# Altium footprint library SparkFun-Connectors.PCBLIB: 409 footprints (part 22 of 26)
Each footprint in its own frame and in the unit in brackets; x right, y up, seen from the top. Pads: shape width x height; smd on the part's side, far side on the other; paste and mask are expansions set on the pad; w line width, h text height; cw(c..) or ccw(c..) is an arc to the next point about the centre after c.
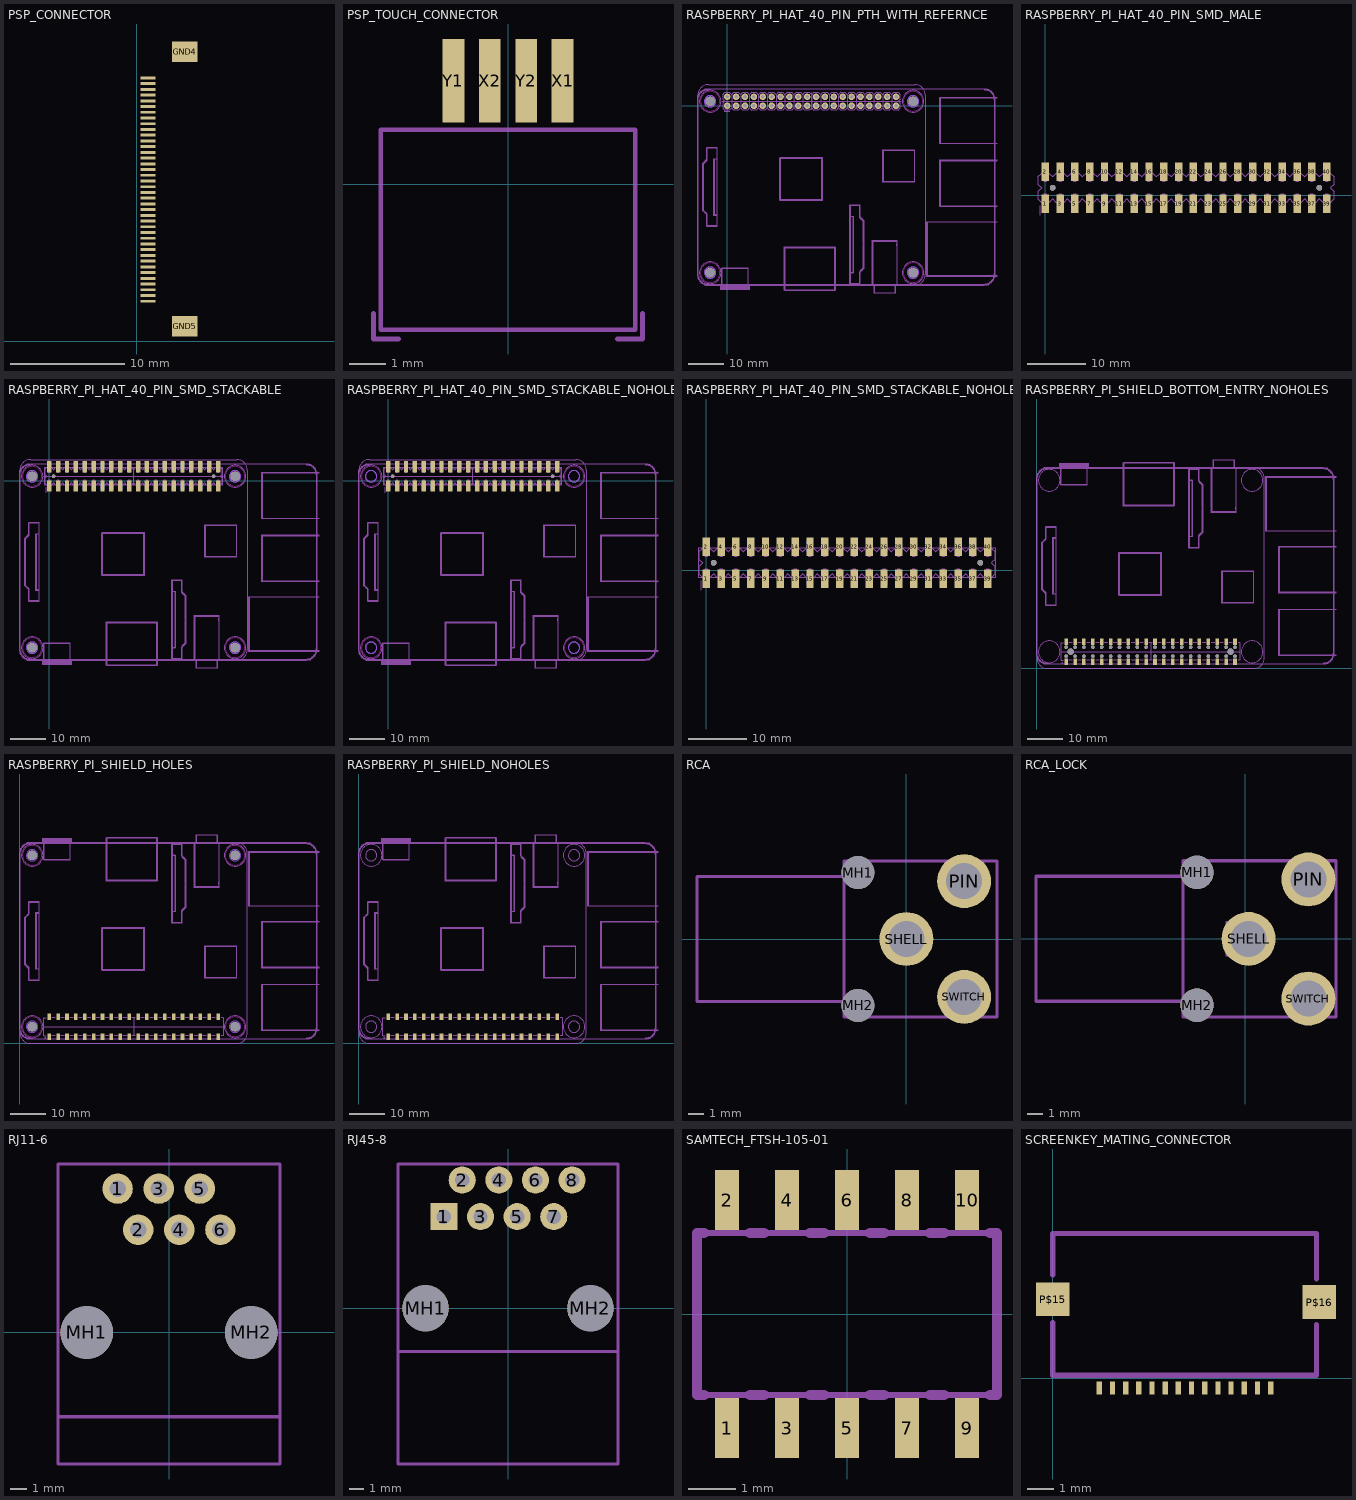
[diagram p21: the footprints below, top view; thin cyan lines are the x and y axes]

## PSP_CONNECTOR [mm]
pads (43):
  rect 0.001x0.001 smd far side: .(4.4,25.3)
  rect 1.27x0.254 smd: AVDD(1,6) AVDD2(1,5.5) B0(1,13) B1(1,12.5) B2(1,12) B3(1,11.5) B4(1,11) B5(1,10.5) B6(1,10) B7(1,9.5) CK(1,8.5) DISP(1,8) G0(1,17) G1(1,16.5) G2(1,16) G3(1,15.5) G4(1,15) G5(1,14.5) G6(1,14) G7(1,13.5) GND(1,23) GND2(1,22.5) GND3(1,9) HSYNC(1,7.5) NC(1,6.5) NC2(1,5) R0(1,21) R1(1,20.5) R2(1,20) R3(1,19.5) R4(1,19) R5(1,18.5) R6(1,18) R7(1,17.5) TEST1(1,4.5) TEST2(1,4) TEST3(1,3.5) VCC(1,22) VCC2(1,21.5) VSYNC(1,7)
  rect 2.2x1.8 smd: GND4(4.2,25.3) GND5(4.2,1.3)

## PSP_TOUCH_CONNECTOR [mil]
pads (4):
  rect 23.62x90.55 smd: X1(59.06,112.2) X2(-19.69,112.2) Y1(-59.06,112.2) Y2(19.69,112.2)
tDocu:
  lines w5: -137.8,-157.48 137.8,-157.48 137.8,59.06 -137.8,59.06 -137.8,-157.48
tPlace:
  lines w5: -145.67,-139.76 -145.67,-167.32 -118.11,-167.32 ; 118.11,-167.32 145.67,-167.32 145.67,-139.76

## RASPBERRY_PI_HAT_40_PIN_PTH_WITH_REFERNCE [mil]
pads (44):
  round 74 hole 40: 1(0,0) 2(0,100) 3(100,0) 4(100,100) 5(200,0) 6(200,100) 7(300,0) 8(300,100) 9(400,0) 10(400,100) 11(500,0) 12(500,100) 13(600,0) 14(600,100) 15(700,0) 16(700,100) 17(800,0) 18(800,100) 19(900,0) 20(900,100) 21(1000,0) 22(1000,100) 23(1100,0) 24(1100,100) 25(1200,0) 26(1200,100) 27(1300,0) 28(1300,100) 29(1400,0) 30(1400,100) 31(1500,0) 32(1500,100) 33(1600,0) 34(1600,100) 35(1700,0) 36(1700,100) 37(1800,0) 38(1800,100) 39(1900,0) 40(1900,100)
  round 108.27 hole 108.27 unplated: MH1(-191.73,-1879) MH2(2091.73,-1879) MH3(2091.73,50.13) MH4(-191.73,50.13)
Top keep-out:
  circle w8: c-191.73,-1879 r63.53
  circle w5: c-191.73,-1879 r110
  circle w5: c2091.73,50.13 r110
  circle w8: c2091.73,50.13 r63.53
  circle w5: c-191.73,50.13 r110
  circle w8: c-191.73,50.13 r63.53
  circle w5: c2091.73,-1879 r110
  circle w8: c2091.73,-1879 r63.53
Bottom keep-out:
  circle w8: c-192.68,-1879 r63.53
  circle w8: c2090.79,50.13 r63.53
  circle w8: c-192.68,50.13 r63.53
  circle w8: c2090.79,-1879 r63.53
tDocu:
  drawing of 40 lines, arcs and shapes, not listed
tPlace:
  lines w8: -35,-65 30,-65 ; 50,-25 25,-50 -25,-50 -50,-25 -50,25 -25,50 -50,75 -50,125 -25,150 25,150 50,125 ; 50,-25 75,-50 125,-50 150,-25 ; 50,-25 50,125 ; 50,125 75,150 125,150 150,125 ; 150,-25 175,-50 225,-50 250,-25 ; 150,-25 150,125 ; 150,125 175,150 225,150 250,125 ; 250,-25 275,-50 325,-50 350,-25 ; 250,-25 250,125 ; 250,125 275,150 325,150 350,125 ; 350,-25 375,-50 425,-50 450,-25 ; 350,-25 350,125 ; 350,125 375,150 425,150 450,125 ; 450,-25 475,-50 525,-50 550,-25 ; 450,-25 450,125 ; 450,125 475,150 525,150 550,125 ; 550,-25 575,-50 625,-50 650,-25 ; 550,-25 550,125 ; 550,125 575,150 625,150 650,125 ; 650,-25 675,-50 725,-50 750,-25 ; 650,-25 650,125 ; 650,125 675,150 725,150 750,125 ; 750,-25 775,-50 825,-50 850,-25 ; 750,-25 750,125 ; 750,125 775,150 825,150 850,125 ; 850,-25 875,-50 925,-50 950,-25 ; 850,-25 850,125 ; 850,125 875,150 925,150 950,125 ; 950,-25 975,-50 1025,-50 1050,-25 ; 950,-25 950,125 ; 950,125 975,150 1025,150 1050,125 ; 1050,-25 1075,-50 1125,-50 1150,-25 ; 1050,-25 1050,125 ; 1050,125 1075,150 1125,150 1150,125 ; 1150,-25 1175,-50 1225,-50 1250,-25 ; 1150,-25 1150,125 ; 1150,125 1175,150 1225,150 1250,125 ; 1250,-25 1250,125 ; 1250,-25 1275,-50 1325,-50 1350,-25 ; 1250,125 1275,150 1325,150 1350,125 ; 1350,-25 1350,125 ; 1350,-25 1375,-50 1425,-50 1450,-25 ; 1350,125 1375,150 1425,150 1450,125 ; 1450,-25 1450,125 ; 1450,-25 1475,-50 1525,-50 1550,-25 ; 1450,125 1475,150 1525,150 1550,125 ; 1550,-25 1550,125 ; 1550,-25 1575,-50 1625,-50 1650,-25 ; 1550,125 1575,150 1625,150 1650,125 ; 1650,-25 1650,125 ; 1650,-25 1675,-50 1725,-50 1750,-25 ; 1650,125 1675,150 1725,150 1750,125 ; 1750,-25 1750,125 ; 1750,-25 1775,-50 1825,-50 1850,-25 ; 1750,125 1775,150 1825,150 1850,125 ; 1850,-25 1850,125 ; 1850,-25 1875,-50 1925,-50 1950,-25 1950,25 1925,50 1950,75 1950,125 1925,150 1875,150 1850,125
bPlace:
  lines w8: -35,-65 30,-65
Reference:
  drawing of 2050 lines, arcs and shapes, not listed
  text "AUDIO" at 1806,-1665 h77.5
  text "HDMI" at 845,-1783 h77.5
  text "CAMERA" at 1501,-1426 h77.5
  text "DISPLAY" at -189,-764 h77.5
  text "USB" at 27,-1899 h77.5
  text "USB" at 2659,-844 h77.5
  text "USB" at 2654,-89 h77.5
  text "ETHERNET" at 2448,-1591 h77.5

## RASPBERRY_PI_HAT_40_PIN_SMD_MALE [mil]
pads (42):
  rect 50x125 smd: 1(0,-57.5) 2(0,157.5) 3(100,-57.5) 4(100,157.5) 5(200,-57.5) 6(200,157.5) 7(300,-57.5) 8(300,157.5) 9(400,-57.5) 10(400,157.5) 11(500,-57.5) 12(500,157.5) 13(600,-57.5) 14(600,157.5) 15(700,-57.5) 16(700,157.5) 17(800,-57.5) 18(800,157.5) 19(900,-57.5) 20(900,157.5) 21(1000,-57.5) 22(1000,157.5) 23(1100,-57.5) 24(1100,157.5) 25(1200,-57.5) 26(1200,157.5) 27(1300,-57.5) 28(1300,157.5) 29(1400,-57.5) 30(1400,157.5) 31(1500,-57.5) 32(1500,157.5) 33(1600,-57.5) 34(1600,157.5) 35(1700,-57.5) 36(1700,157.5) 37(1800,-57.5) 38(1800,157.5) 39(1900,-57.5) 40(1900,157.5)
  round 39.37 hole 39.37 unplated: MH1(50,50) MH2(1850,50)
tDocu:
  drawing of 40 lines, arcs and shapes, not listed
tPlace:
  lines w8: -34,-136 -34,-71 ; -50,-25 -50,25 -25,50 -50,75 -50,125 -25,150 25,150 50,125 75,150 125,150 150,125 175,150 225,150 250,125 275,150 325,150 350,125 375,150 425,150 450,125 475,150 525,150 550,125 575,150 625,150 650,125 675,150 725,150 750,125 775,150 825,150 850,125 875,150 925,150 950,125 975,150 1025,150 1050,125 1075,150 1125,150 1150,125 1175,150 1225,150 1250,125 1275,150 1325,150 1350,125 1375,150 1425,150 1450,125 1475,150 1525,150 1550,125 1575,150 1625,150 1650,125 1675,150 1725,150 1750,125 1775,150 1825,150 1850,125 1875,150 1925,150 1950,125 1950,75 1925,50 1950,25 1950,-25 1925,-50 1875,-50 1850,-25 1825,-50 1775,-50 1750,-25 1725,-50 1675,-50 1650,-25 1625,-50 1575,-50 1550,-25 1525,-50 1475,-50 1450,-25 1425,-50 1375,-50 1350,-25 1325,-50 1275,-50 1250,-25 1225,-50 1175,-50 1150,-25 1125,-50 1075,-50 1050,-25 1025,-50 975,-50 950,-25 925,-50 875,-50 850,-25 825,-50 775,-50 750,-25 725,-50 675,-50 650,-25 625,-50 575,-50 550,-25 525,-50 475,-50 450,-25 425,-50 375,-50 350,-25 325,-50 275,-50 250,-25 225,-50 175,-50 150,-25 125,-50 75,-50 50,-25 25,-50 -25,-50 -50,-25

## RASPBERRY_PI_HAT_40_PIN_SMD_STACKABLE [mil]
pads (86):
  rect 50x125 smd: 1(0,-57.5) 2(0,157.5) 3(100,-57.5) 4(100,157.5) 5(200,-57.5) 6(200,157.5) 7(300,-57.5) 8(300,157.5) 9(400,-57.5) 10(400,157.5) 11(500,-57.5) 12(500,157.5) 13(600,-57.5) 14(600,157.5) 15(700,-57.5) 16(700,157.5) 17(800,-57.5) 18(800,157.5) 19(900,-57.5) 20(900,157.5) 21(1000,-57.5) 22(1000,157.5) 23(1100,-57.5) 24(1100,157.5) 25(1200,-57.5) 26(1200,157.5) 27(1300,-57.5) 28(1300,157.5) 29(1400,-57.5) 30(1400,157.5) 31(1500,-57.5) 32(1500,157.5) 33(1600,-57.5) 34(1600,157.5) 35(1700,-57.5) 36(1700,157.5) 37(1800,-57.5) 38(1800,157.5) 39(1900,-57.5) 40(1900,157.5)
  rect 40.16x73.62 smd far side: 1B(0,-62.5) 2B(0,162.5) 3B(100,-62.5) 4B(100,162.5) 5B(200,-62.5) 6B(200,162.5) 7B(300,-62.5) 8B(300,162.5) 9B(400,-62.5) 10B(400,162.5) 11B(500,-62.5) 12B(500,162.5) 13B(600,-62.5) 14B(600,162.5) 15B(700,-62.5) 16B(700,162.5) 17B(800,-62.5) 18B(800,162.5) 19B(900,-62.5) 20B(900,162.5) 21B(1000,-62.5) 22B(1000,162.5) 23B(1100,-62.5) 24B(1100,162.5) 25B(1200,-62.5) 26B(1200,162.5) 27B(1300,-62.5) 28B(1300,162.5) 29B(1400,-62.5) 30B(1400,162.5) 31B(1500,-62.5) 32B(1500,162.5) 33B(1600,-62.5) 34B(1600,162.5) 35B(1700,-62.5) 36B(1700,162.5) 37B(1800,-62.5) 38B(1800,162.5) 39B(1900,-62.5) 40B(1900,162.5)
  round 108.27 hole 108.27 unplated: MH1(-191.73,-1879) MH2(2091.73,-1879) MH3(2091.73,50.13) MH4(-191.73,50.13)
  round 39.37 hole 39.37 unplated: MH5(50,50) MH6(1850,50)
Top keep-out:
  circle w8: c-191.73,-1879 r63.53
  circle w5: c-191.73,-1879 r110
  circle w5: c2091.73,50.13 r110
  circle w8: c2091.73,50.13 r63.53
  circle w5: c-191.73,50.13 r110
  circle w8: c-191.73,50.13 r63.53
  circle w5: c2091.73,-1879 r110
  circle w8: c2091.73,-1879 r63.53
Bottom keep-out:
  circle w8: c-192.68,-1879 r63.53
  circle w8: c2090.79,50.13 r63.53
  circle w8: c-192.68,50.13 r63.53
  circle w8: c2090.79,-1879 r63.53
tDocu:
  drawing of 40 lines, arcs and shapes, not listed
tPlace:
  lines w8: -34,-136 -34,-71 ; -50,-25 -50,25 -25,50 -50,75 -50,125 -25,150 25,150 50,125 75,150 125,150 150,125 175,150 225,150 250,125 275,150 325,150 350,125 375,150 425,150 450,125 475,150 525,150 550,125 575,150 625,150 650,125 675,150 725,150 750,125 775,150 825,150 850,125 875,150 925,150 950,125 975,150 1025,150 1050,125 1075,150 1125,150 1150,125 1175,150 1225,150 1250,125 1275,150 1325,150 1350,125 1375,150 1425,150 1450,125 1475,150 1525,150 1550,125 1575,150 1625,150 1650,125 1675,150 1725,150 1750,125 1775,150 1825,150 1850,125 1875,150 1925,150 1950,125 1950,75 1925,50 1950,25 1950,-25 1925,-50 1875,-50 1850,-25 1825,-50 1775,-50 1750,-25 1725,-50 1675,-50 1650,-25 1625,-50 1575,-50 1550,-25 1525,-50 1475,-50 1450,-25 1425,-50 1375,-50 1350,-25 1325,-50 1275,-50 1250,-25 1225,-50 1175,-50 1150,-25 1125,-50 1075,-50 1050,-25 1025,-50 975,-50 950,-25 925,-50 875,-50 850,-25 825,-50 775,-50 750,-25 725,-50 675,-50 650,-25 625,-50 575,-50 550,-25 525,-50 475,-50 450,-25 425,-50 375,-50 350,-25 325,-50 275,-50 250,-25 225,-50 175,-50 150,-25 125,-50 75,-50 50,-25 25,-50 -25,-50 -50,-25
  text "MALE" at 912,49 h59.5
bPlace:
  lines w8: -50.64,150.17 1949.64,150.17 1949.64,-50.17 -50.64,-50.17 -50.64,150.23 ; -34,-136 -34,-71
  text "FEMALE" at 897,49 h59.5
Reference:
  drawing of 2050 lines, arcs and shapes, not listed
  text "AUDIO" at 1806,-1665 h77.5
  text "HDMI" at 845,-1783 h77.5
  text "CAMERA" at 1501,-1426 h77.5
  text "DISPLAY" at -189,-764 h77.5
  text "USB" at 27,-1899 h77.5
  text "USB" at 2659,-844 h77.5
  text "USB" at 2654,-89 h77.5
  text "ETHERNET" at 2448,-1591 h77.5

## RASPBERRY_PI_HAT_40_PIN_SMD_STACKABLE_NOHOLES [mil]
pads (82):
  rect 50x125 smd: 1(0,-57.5) 2(0,157.5) 3(100,-57.5) 4(100,157.5) 5(200,-57.5) 6(200,157.5) 7(300,-57.5) 8(300,157.5) 9(400,-57.5) 10(400,157.5) 11(500,-57.5) 12(500,157.5) 13(600,-57.5) 14(600,157.5) 15(700,-57.5) 16(700,157.5) 17(800,-57.5) 18(800,157.5) 19(900,-57.5) 20(900,157.5) 21(1000,-57.5) 22(1000,157.5) 23(1100,-57.5) 24(1100,157.5) 25(1200,-57.5) 26(1200,157.5) 27(1300,-57.5) 28(1300,157.5) 29(1400,-57.5) 30(1400,157.5) 31(1500,-57.5) 32(1500,157.5) 33(1600,-57.5) 34(1600,157.5) 35(1700,-57.5) 36(1700,157.5) 37(1800,-57.5) 38(1800,157.5) 39(1900,-57.5) 40(1900,157.5)
  rect 40.16x73.62 smd far side: 1B(0,-62.5) 2B(0,162.5) 3B(100,-62.5) 4B(100,162.5) 5B(200,-62.5) 6B(200,162.5) 7B(300,-62.5) 8B(300,162.5) 9B(400,-62.5) 10B(400,162.5) 11B(500,-62.5) 12B(500,162.5) 13B(600,-62.5) 14B(600,162.5) 15B(700,-62.5) 16B(700,162.5) 17B(800,-62.5) 18B(800,162.5) 19B(900,-62.5) 20B(900,162.5) 21B(1000,-62.5) 22B(1000,162.5) 23B(1100,-62.5) 24B(1100,162.5) 25B(1200,-62.5) 26B(1200,162.5) 27B(1300,-62.5) 28B(1300,162.5) 29B(1400,-62.5) 30B(1400,162.5) 31B(1500,-62.5) 32B(1500,162.5) 33B(1600,-62.5) 34B(1600,162.5) 35B(1700,-62.5) 36B(1700,162.5) 37B(1800,-62.5) 38B(1800,162.5) 39B(1900,-62.5) 40B(1900,162.5)
  round 39.37 hole 39.37 unplated: MH1(50,50) MH2(1850,50)
Top keep-out:
  circle w8: c-191.73,-1879 r63.53
  circle w5: c-191.73,-1879 r110
  circle w5: c2091.73,50.13 r110
  circle w8: c2091.73,50.13 r63.53
  circle w5: c-191.73,50.13 r110
  circle w8: c-191.73,50.13 r63.53
  circle w5: c2091.73,-1879 r110
  circle w8: c2091.73,-1879 r63.53
Bottom keep-out:
  circle w8: c-192.68,-1879 r63.53
  circle w8: c2090.79,50.13 r63.53
  circle w8: c-192.68,50.13 r63.53
  circle w8: c2090.79,-1879 r63.53
tDocu:
  drawing of 40 lines, arcs and shapes, not listed
tPlace:
  lines w8: -34,-136 -34,-71 ; -50,-25 -50,25 -25,50 -50,75 -50,125 -25,150 25,150 50,125 75,150 125,150 150,125 175,150 225,150 250,125 275,150 325,150 350,125 375,150 425,150 450,125 475,150 525,150 550,125 575,150 625,150 650,125 675,150 725,150 750,125 775,150 825,150 850,125 875,150 925,150 950,125 975,150 1025,150 1050,125 1075,150 1125,150 1150,125 1175,150 1225,150 1250,125 1275,150 1325,150 1350,125 1375,150 1425,150 1450,125 1475,150 1525,150 1550,125 1575,150 1625,150 1650,125 1675,150 1725,150 1750,125 1775,150 1825,150 1850,125 1875,150 1925,150 1950,125 1950,75 1925,50 1950,25 1950,-25 1925,-50 1875,-50 1850,-25 1825,-50 1775,-50 1750,-25 1725,-50 1675,-50 1650,-25 1625,-50 1575,-50 1550,-25 1525,-50 1475,-50 1450,-25 1425,-50 1375,-50 1350,-25 1325,-50 1275,-50 1250,-25 1225,-50 1175,-50 1150,-25 1125,-50 1075,-50 1050,-25 1025,-50 975,-50 950,-25 925,-50 875,-50 850,-25 825,-50 775,-50 750,-25 725,-50 675,-50 650,-25 625,-50 575,-50 550,-25 525,-50 475,-50 450,-25 425,-50 375,-50 350,-25 325,-50 275,-50 250,-25 225,-50 175,-50 150,-25 125,-50 75,-50 50,-25 25,-50 -25,-50 -50,-25
  text "MALE" at 912,49 h59.5
bPlace:
  lines w8: -50.64,150.17 1949.64,150.17 1949.64,-50.17 -50.64,-50.17 -50.64,150.23 ; -34,-136 -34,-71
  text "FEMALE" at 897,49 h59.5
Reference:
  drawing of 2050 lines, arcs and shapes, not listed
  text "AUDIO" at 1806,-1665 h77.5
  text "HDMI" at 845,-1783 h77.5
  text "CAMERA" at 1501,-1426 h77.5
  text "DISPLAY" at -189,-764 h77.5
  text "USB" at 27,-1899 h77.5
  text "USB" at 2659,-844 h77.5
  text "USB" at 2654,-89 h77.5
  text "ETHERNET" at 2448,-1591 h77.5

## RASPBERRY_PI_HAT_40_PIN_SMD_STACKABLE_NOHOLES_NOREF [mil]
pads (82):
  rect 50x125 smd: 1(0,-57.5) 2(0,157.5) 3(100,-57.5) 4(100,157.5) 5(200,-57.5) 6(200,157.5) 7(300,-57.5) 8(300,157.5) 9(400,-57.5) 10(400,157.5) 11(500,-57.5) 12(500,157.5) 13(600,-57.5) 14(600,157.5) 15(700,-57.5) 16(700,157.5) 17(800,-57.5) 18(800,157.5) 19(900,-57.5) 20(900,157.5) 21(1000,-57.5) 22(1000,157.5) 23(1100,-57.5) 24(1100,157.5) 25(1200,-57.5) 26(1200,157.5) 27(1300,-57.5) 28(1300,157.5) 29(1400,-57.5) 30(1400,157.5) 31(1500,-57.5) 32(1500,157.5) 33(1600,-57.5) 34(1600,157.5) 35(1700,-57.5) 36(1700,157.5) 37(1800,-57.5) 38(1800,157.5) 39(1900,-57.5) 40(1900,157.5)
  rect 40.16x73.62 smd far side: 1B(0,-62.5) 2B(0,162.5) 3B(100,-62.5) 4B(100,162.5) 5B(200,-62.5) 6B(200,162.5) 7B(300,-62.5) 8B(300,162.5) 9B(400,-62.5) 10B(400,162.5) 11B(500,-62.5) 12B(500,162.5) 13B(600,-62.5) 14B(600,162.5) 15B(700,-62.5) 16B(700,162.5) 17B(800,-62.5) 18B(800,162.5) 19B(900,-62.5) 20B(900,162.5) 21B(1000,-62.5) 22B(1000,162.5) 23B(1100,-62.5) 24B(1100,162.5) 25B(1200,-62.5) 26B(1200,162.5) 27B(1300,-62.5) 28B(1300,162.5) 29B(1400,-62.5) 30B(1400,162.5) 31B(1500,-62.5) 32B(1500,162.5) 33B(1600,-62.5) 34B(1600,162.5) 35B(1700,-62.5) 36B(1700,162.5) 37B(1800,-62.5) 38B(1800,162.5) 39B(1900,-62.5) 40B(1900,162.5)
  round 39.37 hole 39.37 unplated: MH1(50,50) MH2(1850,50)
tDocu:
  drawing of 40 lines, arcs and shapes, not listed
tPlace:
  lines w8: -34,-136 -34,-71 ; -50,-25 -50,25 -25,50 -50,75 -50,125 -25,150 25,150 50,125 75,150 125,150 150,125 175,150 225,150 250,125 275,150 325,150 350,125 375,150 425,150 450,125 475,150 525,150 550,125 575,150 625,150 650,125 675,150 725,150 750,125 775,150 825,150 850,125 875,150 925,150 950,125 975,150 1025,150 1050,125 1075,150 1125,150 1150,125 1175,150 1225,150 1250,125 1275,150 1325,150 1350,125 1375,150 1425,150 1450,125 1475,150 1525,150 1550,125 1575,150 1625,150 1650,125 1675,150 1725,150 1750,125 1775,150 1825,150 1850,125 1875,150 1925,150 1950,125 1950,75 1925,50 1950,25 1950,-25 1925,-50 1875,-50 1850,-25 1825,-50 1775,-50 1750,-25 1725,-50 1675,-50 1650,-25 1625,-50 1575,-50 1550,-25 1525,-50 1475,-50 1450,-25 1425,-50 1375,-50 1350,-25 1325,-50 1275,-50 1250,-25 1225,-50 1175,-50 1150,-25 1125,-50 1075,-50 1050,-25 1025,-50 975,-50 950,-25 925,-50 875,-50 850,-25 825,-50 775,-50 750,-25 725,-50 675,-50 650,-25 625,-50 575,-50 550,-25 525,-50 475,-50 450,-25 425,-50 375,-50 350,-25 325,-50 275,-50 250,-25 225,-50 175,-50 150,-25 125,-50 75,-50 50,-25 25,-50 -25,-50 -50,-25
  text "MALE" at 912,49 h59.5
bPlace:
  lines w8: -50.64,150.17 1949.64,150.17 1949.64,-50.17 -50.64,-50.17 -50.64,150.23 ; -34,-136 -34,-71
  text "FEMALE" at 897,49 h59.5

## RASPBERRY_PI_SHIELD_BOTTOM_ENTRY_NOHOLES [mil]
pads (82):
  rect 40.16x73.62 smd: 1(329.53,301.77) 2(329.53,76.18) 3(429.53,301.77) 4(429.53,76.18) 5(529.53,301.77) 6(529.53,76.18) 7(629.53,301.77) 8(629.53,76.18) 9(729.53,301.77) 10(729.53,76.18) 11(829.53,301.77) 12(829.53,76.18) 13(929.53,301.77) 14(929.53,76.18) 15(1029.53,301.77) 16(1029.53,76.18) 17(1129.53,301.77) 18(1129.53,76.18) 19(1229.53,301.77) 20(1229.53,76.18) 21(1329.53,301.77) 22(1329.53,76.18) 23(1429.53,301.77) 24(1429.53,76.18) 25(1529.53,301.77) 26(1529.53,76.18) 27(1629.53,301.77) 28(1629.53,76.18) 29(1729.53,301.77) 30(1729.53,76.18) 31(1829.53,301.77) 32(1829.53,76.18) 33(1929.53,301.77) 34(1929.53,76.18) 35(2029.53,301.77) 36(2029.53,76.18) 37(2129.53,301.77) 38(2129.53,76.18) 39(2229.53,301.77) 40(2229.53,76.18)
  round 40.16 hole 40.16 unplated: MH1(1229.53,238.98) MH2(1229.53,138.98) MH3(1129.53,138.98) MH4(1129.53,238.98) MH5(1029.53,238.98) MH6(1029.53,138.98) MH7(929.53,138.98) MH8(929.53,238.98) MH9(1429.53,238.98) MH10(1429.53,138.98) MH11(1329.53,138.98) MH12(1329.53,238.98) MH13(629.53,238.98) MH14(629.53,138.98) MH15(529.53,138.98) MH16(529.53,238.98) MH17(429.53,238.98) MH18(429.53,138.98) MH19(329.53,138.98) MH20(329.53,238.98) MH21(829.53,238.98) MH22(829.53,138.98) MH23(729.53,138.98) MH24(729.53,238.98) MH25(1829.53,238.98) MH26(1829.53,138.98) MH27(1729.53,138.98) MH28(1729.53,238.98) MH29(1629.53,238.98) MH30(1629.53,138.98) MH31(1529.53,138.98) MH32(1529.53,238.98) MH33(2029.53,238.98) MH34(2029.53,138.98) MH35(1929.53,138.98) MH36(1929.53,238.98) MH37(2129.53,238.98) MH38(2229.53,238.98) MH39(2229.53,138.98) MH40(2129.53,138.98)
  round 70.87 hole 70.87 unplated: MH41(2179.53,188.98) MH42(379.53,188.98)
tPlace:
  circle w10: c285.43,57.88 r4.4
  lines w8: 294.53,90.55 275.59,90.55 275.59,287.4 294.53,287.4 ; 359.84,90.55 399.21,90.55 ; 359.84,287.4 399.21,287.4 ; 459.84,90.55 499.21,90.55 ; 459.84,287.4 499.21,287.4 ; 559.84,90.55 599.21,90.55 ; 559.84,287.4 599.21,287.4 ; 659.84,90.55 699.21,90.55 ; 659.84,287.4 699.21,287.4 ; 759.84,90.55 799.21,90.55 ; 759.84,287.4 799.21,287.4 ; 859.84,90.55 899.21,90.55 ; 859.84,287.4 899.21,287.4 ; 959.84,90.55 999.21,90.55 ; 959.84,287.4 999.21,287.4 ; 1059.84,90.55 1099.21,90.55 ; 1059.84,287.4 1099.21,287.4 ; 1159.84,90.55 1199.21,90.55 ; 1159.84,287.4 1199.21,287.4 ; 1259.84,90.55 1299.21,90.55 ; 1259.84,287.4 1299.21,287.4 ; 1359.84,90.55 1399.21,90.55 ; 1359.84,287.4 1399.21,287.4 ; 1459.84,90.55 1499.21,90.55 ; 1459.84,287.4 1499.21,287.4 ; 1559.84,90.55 1599.21,90.55 ; 1559.84,287.4 1599.21,287.4 ; 1659.84,90.55 1699.21,90.55 ; 1659.84,287.4 1699.21,287.4 ; 1759.84,90.55 1799.21,90.55 ; 1759.84,287.4 1799.21,287.4 ; 1859.84,90.55 1899.21,90.55 ; 1859.84,287.4 1899.21,287.4 ; 1959.84,90.55 1999.21,90.55 ; 1959.84,287.4 1999.21,287.4 ; 2059.84,90.55 2099.21,90.55 ; 2059.84,287.4 2099.21,287.4 ; 2159.84,90.55 2199.21,90.55 ; 2159.84,287.4 2199.21,287.4 ; 2264.53,90.55 2283.46,90.55 2283.46,287.4 2264.53,287.4
Reference:
  drawing of 2046 lines, arcs and shapes, not listed
  text "AUDIO" at 2136,1903 h77.5
  text "HDMI" at 1175,2021 h77.5
  text "CAMERA" at 1831,1664 h77.5
  text "DISPLAY" at 141,1002 h77.5
  text "USB" at 357,2137 h77.5
  text "USB" at 2989,1082 h77.5
  text "USB" at 2984,327 h77.5
  text "ETHERNET" at 2778,1829 h77.5

## RASPBERRY_PI_SHIELD_HOLES [mil]
pads (44):
  rect 40.16x73.62 smd: 1(330,302.62) 2(330,75.94) 3(430,302.62) 4(430,75.94) 5(530,302.62) 6(530,75.94) 7(630,302.62) 8(630,75.94) 9(730,302.62) 10(730,75.94) 11(830,302.62) 12(830,75.94) 13(930,302.62) 14(930,75.94) 15(1030,302.62) 16(1030,75.94) 17(1130,302.62) 18(1130,75.94) 19(1230,302.62) 20(1230,75.94) 21(1330,302.62) 22(1330,75.94) 23(1430,302.62) 24(1430,75.94) 25(1530,302.62) 26(1530,75.94) 27(1630,302.62) 28(1630,75.94) 29(1730,302.62) 30(1730,75.94) 31(1830,302.62) 32(1830,75.94) 33(1930,302.62) 34(1930,75.94) 35(2030,302.62) 36(2030,75.94) 37(2130,302.62) 38(2130,75.94) 39(2230,302.62) 40(2230,75.94)
  round 108.27 hole 108.27 unplated: MH1(138.27,188) MH2(2421.73,188) MH3(2421.73,2117.13) MH4(138.27,2117.13)
Top keep-out:
  circle w8: c138.27,188 r63.53
  circle w5: c138.27,188 r110
  circle w5: c2421.73,2117.13 r110
  circle w8: c2421.73,2117.13 r63.53
  circle w5: c138.27,2117.13 r110
  circle w8: c138.27,2117.13 r63.53
  circle w5: c2421.73,188 r110
  circle w8: c2421.73,188 r63.53
Bottom keep-out:
  circle w8: c137.32,188 r63.53
  circle w8: c2420.79,2117.13 r63.53
  circle w8: c137.32,2117.13 r63.53
  circle w8: c2420.79,188 r63.53
tPlace:
  circle w10: c285.91,62.02 r4.4
  lines w8: 295,88 270,88 270,288 295,288 ; 360,88 400,88 ; 360,288 400,288 ; 460,88 500,88 ; 460,288 500,288 ; 560,88 600,88 ; 560,288 600,288 ; 660,88 700,88 ; 660,288 700,288 ; 760,88 800,88 ; 760,288 800,288 ; 860,88 900,88 ; 860,288 900,288 ; 960,88 1000,88 ; 960,288 1000,288 ; 1060,88 1100,88 ; 1060,288 1100,288 ; 1160,88 1200,88 ; 1160,288 1200,288 ; 1260,88 1300,88 ; 1260,288 1300,288 ; 1360,88 1400,88 ; 1360,288 1400,288 ; 1460,88 1500,88 ; 1460,288 1500,288 ; 1560,88 1600,88 ; 1560,288 1600,288 ; 1660,88 1700,88 ; 1660,288 1700,288 ; 1760,88 1800,88 ; 1760,288 1800,288 ; 1860,88 1900,88 ; 1860,288 1900,288 ; 1960,88 2000,88 ; 1960,288 2000,288 ; 2060,88 2100,88 ; 2060,288 2100,288 ; 2160,88 2200,88 ; 2160,288 2200,288 ; 2265,88 2290,88 2290,288 2265,288
Reference:
  drawing of 2046 lines, arcs and shapes, not listed
  text "AUDIO" at 2136,1903 h77.5
  text "HDMI" at 1175,2021 h77.5
  text "CAMERA" at 1831,1664 h77.5
  text "DISPLAY" at 141,1002 h77.5
  text "USB" at 357,2137 h77.5
  text "USB" at 2989,1082 h77.5
  text "USB" at 2984,327 h77.5
  text "ETHERNET" at 2778,1829 h77.5

## RASPBERRY_PI_SHIELD_NOHOLES [mil]
pads (40):
  rect 40.16x73.62 smd: 1(330,302.62) 2(330,75.94) 3(430,302.62) 4(430,75.94) 5(530,302.62) 6(530,75.94) 7(630,302.62) 8(630,75.94) 9(730,302.62) 10(730,75.94) 11(830,302.62) 12(830,75.94) 13(930,302.62) 14(930,75.94) 15(1030,302.62) 16(1030,75.94) 17(1130,302.62) 18(1130,75.94) 19(1230,302.62) 20(1230,75.94) 21(1330,302.62) 22(1330,75.94) 23(1430,302.62) 24(1430,75.94) 25(1530,302.62) 26(1530,75.94) 27(1630,302.62) 28(1630,75.94) 29(1730,302.62) 30(1730,75.94) 31(1830,302.62) 32(1830,75.94) 33(1930,302.62) 34(1930,75.94) 35(2030,302.62) 36(2030,75.94) 37(2130,302.62) 38(2130,75.94) 39(2230,302.62) 40(2230,75.94)
tPlace:
  circle w10: c285.91,62.02 r4.4
  lines w8: 295,88 270,88 270,288 295,288 ; 360,88 400,88 ; 360,288 400,288 ; 460,88 500,88 ; 460,288 500,288 ; 560,88 600,88 ; 560,288 600,288 ; 660,88 700,88 ; 660,288 700,288 ; 760,88 800,88 ; 760,288 800,288 ; 860,88 900,88 ; 860,288 900,288 ; 960,88 1000,88 ; 960,288 1000,288 ; 1060,88 1100,88 ; 1060,288 1100,288 ; 1160,88 1200,88 ; 1160,288 1200,288 ; 1260,88 1300,88 ; 1260,288 1300,288 ; 1360,88 1400,88 ; 1360,288 1400,288 ; 1460,88 1500,88 ; 1460,288 1500,288 ; 1560,88 1600,88 ; 1560,288 1600,288 ; 1660,88 1700,88 ; 1660,288 1700,288 ; 1760,88 1800,88 ; 1760,288 1800,288 ; 1860,88 1900,88 ; 1860,288 1900,288 ; 1960,88 2000,88 ; 1960,288 2000,288 ; 2060,88 2100,88 ; 2060,288 2100,288 ; 2160,88 2200,88 ; 2160,288 2200,288 ; 2265,88 2290,88 2290,288 2265,288
Reference:
  drawing of 2048 lines, arcs and shapes, not listed
  text "AUDIO" at 2136,1903 h77.5
  text "HDMI" at 1175,2021 h77.5
  text "CAMERA" at 1831,1664 h77.5
  text "DISPLAY" at 141,1002 h77.5
  text "USB" at 357,2137 h77.5
  text "USB" at 2989,1082 h77.5
  text "USB" at 2984,327 h77.5
  text "ETHERNET" at 2778,1829 h77.5

## RCA [mm]
pads (5):
  round 2.1 hole 2.1 unplated: MH1(-3.1,4.25) MH2(-3.1,-4.25)
  round 3.45 hole 2.3: PIN(3.7,3.7) SHELL(0,0) SWITCH(3.7,-3.7)
tDocu:
  lines w0.203: -4,-4 -13.4,-4 -13.4,4 -4,4 ; -4,-5 -4,5 5.8,5 5.8,-5 -4,-5
tPlace:
  lines w0.203: -4,-3 -4,3 ; -2,-5 2,-5 ; -2,5 2,5 ; 5.8,-5 5.8,5

## RCA_LOCK [mil]
pads (5):
  round 84 hole 84 unplated: MH1(-122.05,167.32) MH2(-122.05,-167.32)
  round 135.82 hole 90.55: PIN(158.67,149.67) SHELL(8,0) SWITCH(158.67,-150.67)
tDocu:
  region: -152,137 -152,196 -93,196 -93,137
  region: -152,-198 -152,-139 -93,-139 -93,-198
  region: -49,-44 -49,44 10,44 10,-44
  region: 113,-153 113,-139 201,-139 201,-153
  region: 113,137 113,151 201,151 201,137
  lines w1: 113,-138 176,-138 ; 113,136 176,136
  lines w8: -157.48,-157.48 -527.56,-157.48 -527.56,157.48 -157.48,157.48 ; -157.48,-196.85 -157.48,196.85 228.35,196.85 228.35,-196.85 -157.48,-196.85
tPlace:
  lines w8: -157.48,-118.11 -157.48,118.11 ; -78.74,-196.85 78.74,-196.85 ; -78.74,196.85 78.74,196.85 ; 228.35,-196.85 228.35,196.85

## RJ11-6 [mil]
pads (8):
  round 74 hole 40: 1(-125,350) 2(-75,250) 3(-25,350) 4(25,250) 5(75,350) 6(125,250)
  round 128 hole 128 unplated: MH1(-200,0) MH2(200,0)
tDocu:
  lines w8: -270,-205 -270,-320 270,-320 270,-205
tPlace:
  lines w8: -270,-205 -270,410 270,410 270,-205 -270,-205

## RJ45-8 [mil]
pads (10):
  rect 74x74 / inner round 68.37 / far side rect 74x74 hole 39.37: 1(-175,250)
  round 74 hole 39.37: 2(-125,350) 3(-75,250) 4(-25,350) 5(25,250) 6(75,350) 7(125,250) 8(175,350)
  round 125.98 hole 125.98 unplated: MH1(-225,0) MH2(225,0)
tDocu:
  lines w8: -300,-118.11 -300,-425.2 300,-425.2 300,-118.11
tPlace:
  lines w8: -300,-118.11 -300,393.7 300,393.7 300,-118.11 -300,-118.11

## SAMTECH_FTSH-105-01 [mil]
pads (10):
  rect 20x50 smd: 1(-100,-95) 2(-100,95) 3(-50,-95) 4(-50,95) 5(0,-95) 6(0,95) 7(50,-95) 8(50,95) 9(100,-95) 10(100,95)
tDocu:
  region: -8,67.5 -8,115 8,115 8,67.5
  region: 42,67.5 42,115 58,115 58,67.5
  region: 92,67.5 92,115 108,115 108,67.5
  region: -58,67.5 -58,115 -42,115 -42,67.5
  region: -108,67.5 -108,115 -92,115 -92,67.5
  region: 8,-67.5 8,-115 -8,-115 -8,-67.5
  region: -42,-67.5 -42,-115 -58,-115 -58,-67.5
  region: -92,-67.5 -92,-115 -108,-115 -108,-67.5
  region: 58,-67.5 58,-115 42,-115 42,-67.5
  region: 108,-67.5 108,-115 92,-115 92,-67.5
  lines w5: -125,-67.5 125,-67.5 125,67.5 -125,67.5 -125,-67.5
tPlace:
  lines w8: -119,-67.5 -125,-67.5 -125,67.5 -119,67.5 ; -81,-67.5 -69,-67.5 ; -81,67.5 -69,67.5 ; -31,-67.5 -19,-67.5 ; -31,67.5 -19,67.5 ; 19,-67.5 31,-67.5 ; 19,67.5 31,67.5 ; 69,-67.5 81,-67.5 ; 69,67.5 81,67.5 ; 119,-67.5 125,-67.5 125,67.5 119,67.5

## SCREENKEY_MATING_CONNECTOR [mm]
pads (16):
  rect 0.2x0.5 smd: 1(1.76,-0.36) 2(2.26,-0.36) 3(2.76,-0.36) 4(3.26,-0.36) 5(3.76,-0.36) 6(4.26,-0.36) 7(4.76,-0.36) 8(5.26,-0.36) 9(5.76,-0.36) 10(6.26,-0.36) 11(6.76,-0.36) 12(7.26,-0.36) 13(7.76,-0.36) 14(8.26,-0.36)
  rect 1.28x1.28 smd: P$15(0,3) P$16(10.1,2.9)
tPlace:
  lines w0.203: 0,2.108 0,0.127 10,0.127 10,2.032 ; 0,3.937 0,5.486 ; 0,5.5 10,5.5 10,3.785